# Altium footprint library ConnectorsTDH.PcbLib: 194 footprints (part 6 of 13)
Each footprint in its own frame and in the unit in brackets; x right, y up, seen from the top. Pads: shape width x height; smd on the part's side, far side on the other; paste and mask are expansions set on the pad; w line width, h text height; cw(c..) or ccw(c..) is an arc to the next point about the centre after c.
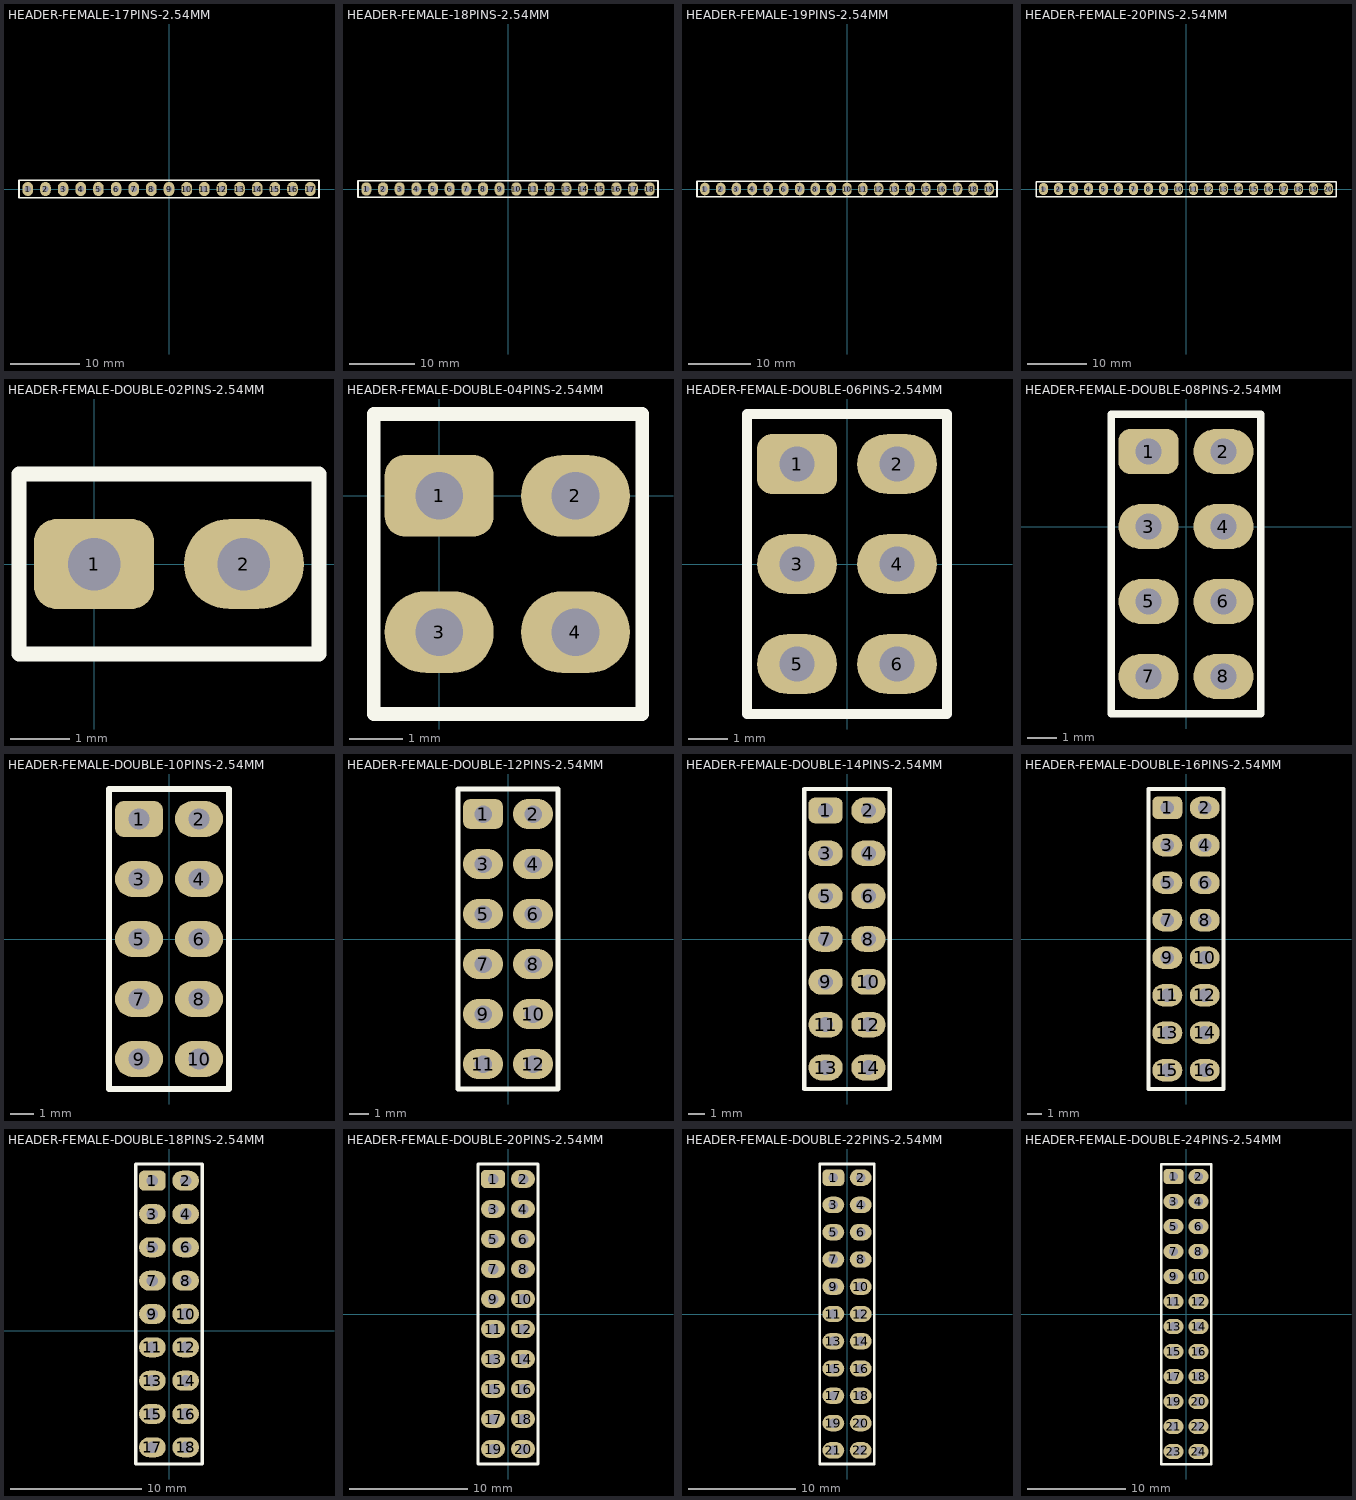
[diagram p5: the footprints below, top view; thin cyan lines are the x and y axes]

## HEADER-FEMALE-17PINS-2.54MM [mil]
pads (17):
  oval 60x80 hole 35: 1(-800,0) 2(-700,0) 3(-600,0) 4(-500,0) 5(-400,0) 6(-300,0) 7(-200,0) 8(-100,0) 9(0,0) 10(100,0) 11(200,0) 12(300,0) 13(400,0) 14(500,0) 15(600,0) 16(700,0) 17(800,0)
Top Overlay:
  lines w10: -850,-50 -850,50 850,50 850,-50 -850,-50
3D body "17-Pin Header - Female - 2.54mm.step": height 196.85, standoff -118.11, extent -859.84,-49.21 859.85,49.22

## HEADER-FEMALE-18PINS-2.54MM [mil]
pads (18):
  oval 60x80 hole 35: 1(-850,0) 2(-750,0) 3(-650,0) 4(-550,0) 5(-450,0) 6(-350,0) 7(-250,0) 8(-150,0) 9(-50,0) 10(50,0) 11(150,0) 12(250,0) 13(350,0) 14(450,0) 15(550,0) 16(650,0) 17(750,0) 18(850,0)
Top Overlay:
  lines w10: -900,-50 -900,50 900,50 900,-50 -900,-50
3D body "18-Pin Header - Female - 2.54mm.step": height 196.85, standoff -118.11, extent -909.84,-49.21 909.85,49.22

## HEADER-FEMALE-19PINS-2.54MM [mil]
pads (19):
  oval 60x80 hole 35: 1(-900,0) 2(-800,0) 3(-700,0) 4(-600,0) 5(-500,0) 6(-400,0) 7(-300,0) 8(-200,0) 9(-100,0) 10(0,0) 11(100,0) 12(200,0) 13(300,0) 14(400,0) 15(500,0) 16(600,0) 17(700,0) 18(800,0) 19(900,0)
Top Overlay:
  lines w10: -950,-50 -950,50 950,50 950,-50 -950,-50
3D body "19-Pin Header - Female - 2.54mm.step": height 196.85, standoff -118.11, extent -959.84,-49.21 959.85,49.22

## HEADER-FEMALE-20PINS-2.54MM [mil]
pads (20):
  oval 60x80 hole 35: 1(-950,0) 2(-850,0) 3(-750,0) 4(-650,0) 5(-550,0) 6(-450,0) 7(-350,0) 8(-250,0) 9(-150,0) 10(-50,0) 11(50,0) 12(150,0) 13(250,0) 14(350,0) 15(450,0) 16(550,0) 17(650,0) 18(750,0) 19(850,0) 20(950,0)
Top Overlay:
  lines w10: -1000,-50 -1000,50 1000,50 1000,-50 -1000,-50
3D body "20-Pin Header - Female - 2.54mm.step": height 196.85, standoff -118.11, extent -1009.84,-49.21 1009.85,49.22

## HEADER-FEMALE-DOUBLE-02PINS-2.54MM [mil]
pads (2):
  rrect50% 80x60 hole 35: 1(0,0)
  oval 80x60 hole 35: 2(100,0)
Top Overlay:
  lines w10: -50,-60 -50,60 150,60 150,-60 -50,-60
3D body "2-Pin Header - Female - Double - 2.54mm.step": height 334.65, standoff -118.11, extent -47.64,-59.84 149.21,59.85

## HEADER-FEMALE-DOUBLE-04PINS-2.54MM [mil]
pads (4):
  rrect50% 80x60 hole 35: 1(0,0)
  oval 80x60 hole 35: 2(100,0) 3(0,-100) 4(100,-100)
Top Overlay:
  lines w10: -48,-160 -48,60 149,60 149,-160 -48,-160
3D body "4-Pin Header - Female - Double - 2.54mm.step": height 334.65, standoff -118.11, extent -47.64,-159.84 149.21,59.85

## HEADER-FEMALE-DOUBLE-06PINS-2.54MM [mil]
pads (6):
  rrect50% 80x60 hole 35: 1(-50,100)
  oval 80x60 hole 35: 2(50,100) 3(-50,0) 4(50,0) 5(-50,-100) 6(50,-100)
Top Overlay:
  lines w10: -100,-150 -100,150 100,150 100,-150 -100,-150
3D body "6-Pin Header - Female - Double - 2.54mm.step": height 334.65, standoff -118.11, extent -97.64,-159.84 99.21,159.85

## HEADER-FEMALE-DOUBLE-08PINS-2.54MM [mil]
pads (8):
  rrect50% 80x60 hole 35: 1(-50,100)
  oval 80x60 hole 35: 2(50,100) 3(-50,0) 4(50,0) 5(-50,-100) 6(50,-100) 7(-50,-200) 8(50,-200)
Top Overlay:
  lines w10: -100,-250 -100,150 100,150 100,-250 -100,-250
3D body "8-Pin Header - Female - Double - 2.54mm.step": height 334.65, standoff -118.11, extent -100,-259.84 96.85,159.84

## HEADER-FEMALE-DOUBLE-10PINS-2.54MM [mil]
pads (10):
  rrect50% 80x60 hole 35: 1(-50,200)
  oval 80x60 hole 35: 2(50,200) 3(-50,100) 4(50,100) 5(-50,0) 6(50,0) 7(-50,-100) 8(50,-100) 9(-50,-200) 10(50,-200)
Top Overlay:
  lines w10: -100,-250 -100,242.26 -100,250 100,250 100,-250 -100,-250
3D body "10-Pin Header - Female - Double - 2.54mm.step": height 334.65, standoff -118.11, extent -97.64,-259.84 99.21,259.85

## HEADER-FEMALE-DOUBLE-12PINS-2.54MM [mil]
pads (12):
  rrect50% 80x60 hole 35: 1(-50,250)
  oval 80x60 hole 35: 2(50,250) 3(-50,150) 4(50,150) 5(-50,50) 6(50,50) 7(-50,-50) 8(50,-50) 9(-50,-150) 10(50,-150) 11(-50,-250) 12(50,-250)
Top Overlay:
  lines w10: -100,-300 -100,300 100,300 100,-300 -100,-300
3D body "12-Pin Header - Female - Double - 2.54mm.step": height 334.65, standoff -118.11, extent -97.64,-309.84 99.21,309.85

## HEADER-FEMALE-DOUBLE-14PINS-2.54MM [mil]
pads (14):
  rrect50% 80x60 hole 35: 1(-50,300)
  oval 80x60 hole 35: 2(50,300) 3(-50,200) 4(50,200) 5(-50,100) 6(50,100) 7(-50,0) 8(50,0) 9(-50,-100) 10(50,-100) 11(-50,-200) 12(50,-200) 13(-50,-300) 14(50,-300)
Top Overlay:
  lines w10: -100,-350 100,-350 100,350 -100,350 -100,-350
3D body "14-Pin Header - Female - Double - 2.54mm.step": height 334.65, standoff -118.11, extent -97.64,-359.84 99.21,359.85

## HEADER-FEMALE-DOUBLE-16PINS-2.54MM [mil]
pads (16):
  rrect50% 80x60 hole 35: 1(-50,350)
  oval 80x60 hole 35: 2(50,350) 3(-50,250) 4(50,250) 5(-50,150) 6(50,150) 7(-50,50) 8(50,50) 9(-50,-50) 10(50,-50) 11(-50,-150) 12(50,-150) 13(-50,-250) 14(50,-250) 15(-50,-350) 16(50,-350)
Top Overlay:
  lines w10: -100,-400 100,-400 100,400 -100,400 -100,-400
3D body "16-Pin Header - Female - Double - 2.54mm.step": height 334.65, standoff -118.11, extent -97.64,-409.84 99.21,409.85

## HEADER-FEMALE-DOUBLE-18PINS-2.54MM [mil]
pads (18):
  rrect50% 80x60 hole 35: 1(-50,450)
  oval 80x60 hole 35: 2(50,450) 3(-50,350) 4(50,350) 5(-50,250) 6(50,250) 7(-50,150) 8(50,150) 9(-50,50) 10(50,50) 11(-50,-50) 12(50,-50) 13(-50,-150) 14(50,-150) 15(-50,-250) 16(50,-250) 17(-50,-350) 18(50,-350)
Top Overlay:
  lines w10: -100,-400 100,-400 100,500 -100,500 -100,-400
3D body "18-Pin Header - Female - Double - 2.54mm.step": height 334.65, standoff -118.11, extent -97.64,-409.84 99.21,509.85

## HEADER-FEMALE-DOUBLE-20PINS-2.54MM [mil]
pads (20):
  rrect50% 80x60 hole 35: 1(-50,450)
  oval 80x60 hole 35: 2(50,450) 3(-50,350) 4(50,350) 5(-50,250) 6(50,250) 7(-50,150) 8(50,150) 9(-50,50) 10(50,50) 11(-50,-50) 12(50,-50) 13(-50,-150) 14(50,-150) 15(-50,-250) 16(50,-250) 17(-50,-350) 18(50,-350) 19(-50,-450) 20(50,-450)
Top Overlay:
  lines w10: -100,-500 100,-500 100,500 -100,500 -100,-500
3D body "20-Pin Header - Female - Double - 2.54mm.step": height 334.65, standoff -118.11, extent -97.64,-509.84 99.21,509.85

## HEADER-FEMALE-DOUBLE-22PINS-2.54MM [mil]
pads (22):
  rrect50% 80x60 hole 35: 1(-50,500)
  oval 80x60 hole 35: 2(50,500) 3(-50,400) 4(50,400) 5(-50,300) 6(50,300) 7(-50,200) 8(50,200) 9(-50,100) 10(50,100) 11(-50,0) 12(50,0) 13(-50,-100) 14(50,-100) 15(-50,-200) 16(50,-200) 17(-50,-300) 18(50,-300) 19(-50,-400) 20(50,-400) 21(-50,-500) 22(50,-500)
Top Overlay:
  lines w10: -100,-550 100,-550 100,550 -100,550 -100,-550
3D body "22-Pin Header - Female - Double - 2.54mm.step": height 334.65, standoff -118.11, extent -97.64,-559.84 99.21,559.85

## HEADER-FEMALE-DOUBLE-24PINS-2.54MM [mil]
pads (24):
  rrect50% 80x60 hole 35: 1(-50,550)
  oval 80x60 hole 35: 2(50,550) 3(-50,450) 4(50,450) 5(-50,350) 6(50,350) 7(-50,250) 8(50,250) 9(-50,150) 10(50,150) 11(-50,50) 12(50,50) 13(-50,-50) 14(50,-50) 15(-50,-150) 16(50,-150) 17(-50,-250) 18(50,-250) 19(-50,-350) 20(50,-350) 21(-50,-450) 22(50,-450) 23(-50,-550) 24(50,-550)
Top Overlay:
  lines w10: -100,-600 -100,600 100,600 100,-600 -100,-600
3D body "24-Pin Header - Female - Double - 2.54mm.step": height 334.65, standoff -118.11, extent -97.64,-609.84 99.21,609.85